# Altium footprint library SoM_Artix.PcbLib: 239 footprints (part 9 of 15)
Each footprint in its own frame and in the unit in brackets; x right, y up, seen from the top. Pads: shape width x height; smd on the part's side, far side on the other; paste and mask are expansions set on the pad; w line width, h text height; cw(c..) or ccw(c..) is an arc to the next point about the centre after c.
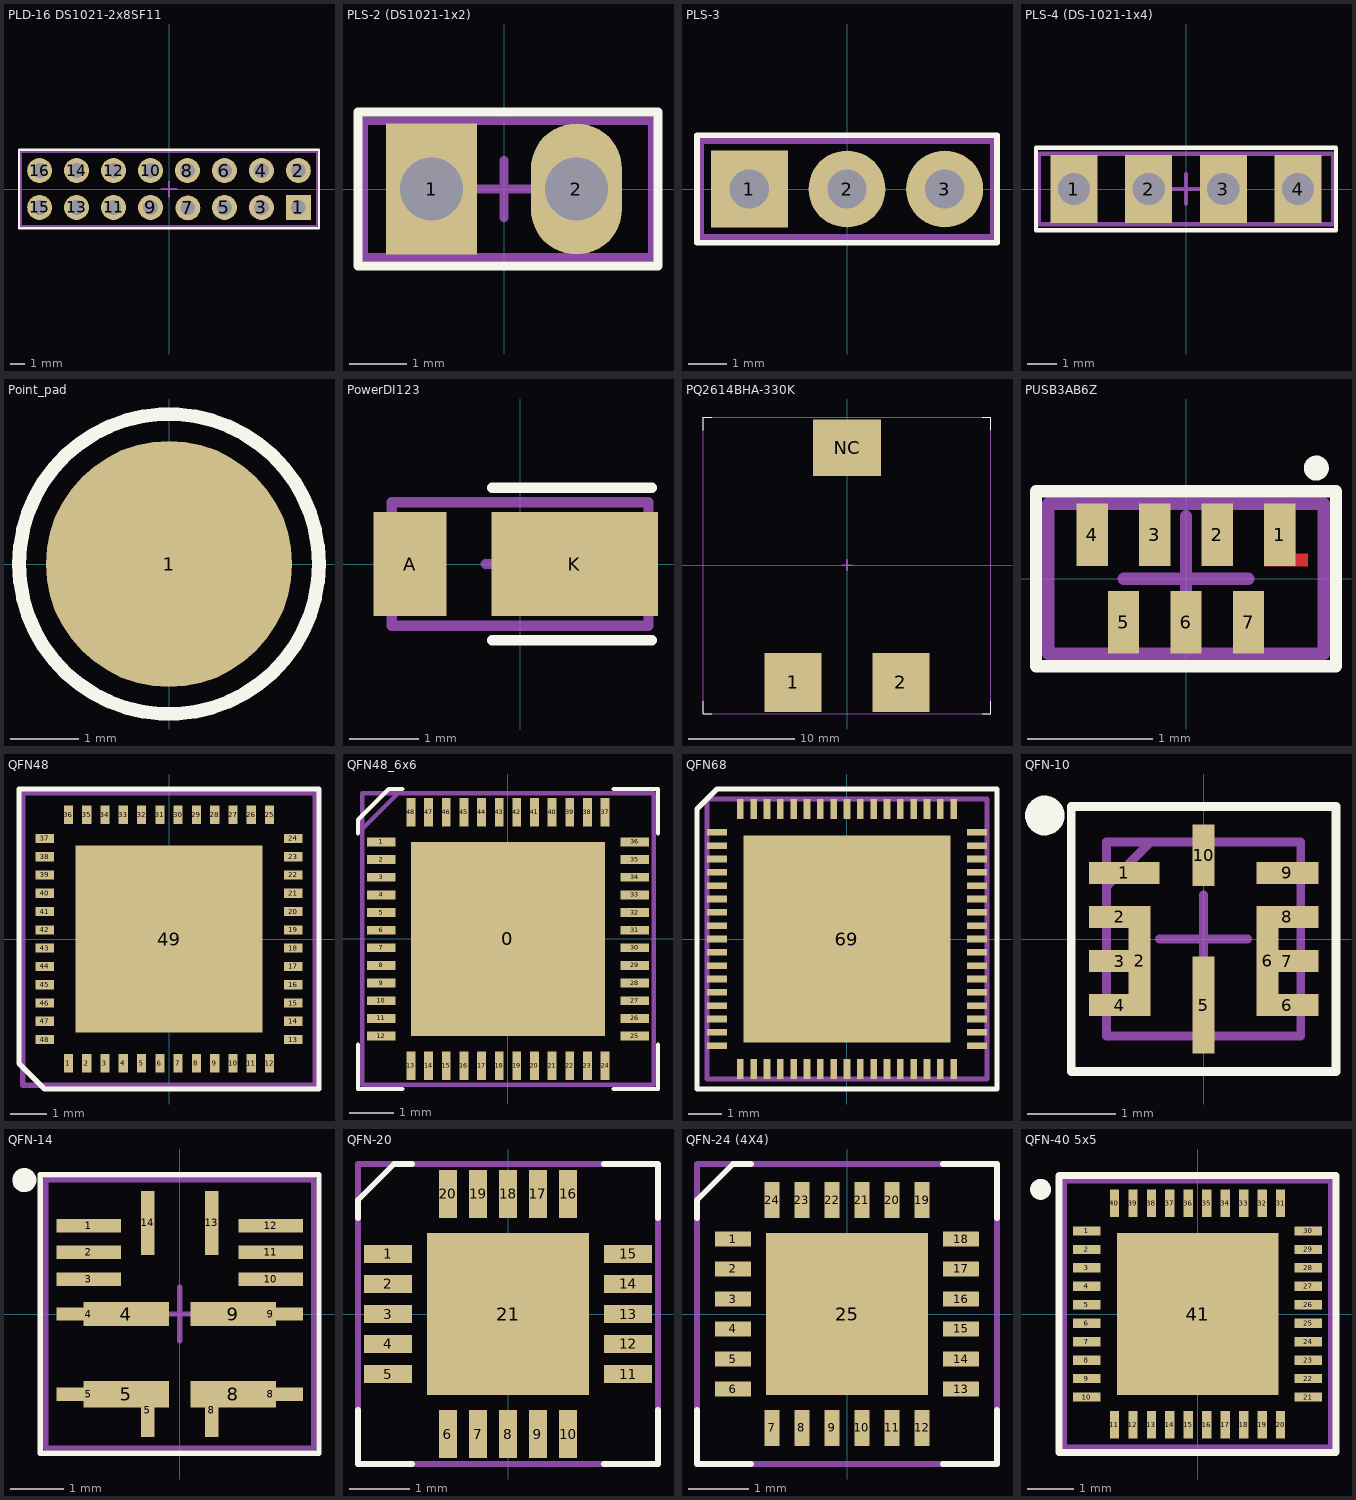
[diagram p8: the footprints below, top view; thin cyan lines are the x and y axes]

## PLD-16 DS1021-2x8SF11 [mm]
pads (16):
  rect 1.7x1.7 hole 1: 1(8.89,-1.27)
  round 1.7 hole 1: 2(8.89,1.27) 3(6.35,-1.27) 4(6.35,1.27) 5(3.81,-1.27) 6(3.81,1.27) 7(1.3,-1.3) 8(1.27,1.27) 9(-1.27,-1.27) 10(-1.27,1.27) 11(-3.81,-1.27) 12(-3.81,1.27) 13(-6.35,-1.27) 14(-6.35,1.27) 15(-8.89,-1.27) 16(-8.89,1.27)
Top Overlay:
  lines w0.15: -10.3,-2.7 10.3,-2.7 10.3,2.7 -10.3,2.7 -10.3,-2.7
Mechanical 15:
  lines w0.15: -0.5,0 0.5,0 ; 0,-0.5 0,0.5 ; -10.16,-2.54 -10.16,2.54 10.16,2.54 10.16,-2.54 -10.16,-2.54
3D body "User Library-DS1021_Male.step": height 8.54, standoff -2.96, extent -10.16,-2.55 10.16,2.53

## PLS-2 (DS1021-1x2) [mm] "2 point header"
pads (2):
  rect 1.6x2.3 hole 1.1: 1(-1.27,0)
  oval 1.6x2.3 hole 1.1: 2(1.27,0)
Top Overlay:
  lines w0.15: -2.56,-1.35 2.7,-1.35 2.7,1.35 -2.56,1.35 -2.56,-1.35
Mechanical 13:
  lines w0.15: -0.5,0 0.5,0 ; 0,-0.5 0,0.5 ; -2.46,-1.2 -2.46,1.2 2.6,1.2 2.6,-1.2 -2.46,-1.2
3D body "User Library-PLS-2-1.STEP": height 7.83, standoff -2.97, extent -2.48,-1.27 2.6,1.27

## PLS-3 [mm]
pads (3):
  rect 2x2 hole 1.02 mask+0.07: 1(-2.54,0)
  round 2 hole 1.02 mask+0.07: 2(0,0) 3(2.54,0)
Top Overlay:
  lines w0.15: -3.9,-1.4 -3.9,1.4 3.9,1.4 3.9,-1.4 -3.9,-1.4
Mechanical 15:
  lines w0.15: -0.5,0 0.5,0 ; 0,-0.5 0,0.5 ; -3.79,-1.25 3.79,-1.25 3.79,1.25 -3.79,1.25 -3.79,-1.25
3D body "User Library-PLS-03.step": height 8, standoff -3.3, extent -3.81,-1.25 3.81,1.25

## PLS-4 (DS-1021-1x4) [mm] "4 point header"
pads (4):
  rect 1.6x2.3 hole 1.1: 1(-3.81,0) 2(-1.27,0) 3(1.27,0) 4(3.81,0)
Top Overlay:
  lines w0.15: -5.1,-1.4 5.1,-1.4 5.1,1.4 -5.1,1.4 -5.1,-1.4
Mechanical 13:
  lines w0.15: -0.5,0 0.5,0 ; 0,-0.5 0,0.5 ; -5,-1.2 -5,1.2 5,1.2 5,-1.2 -5,-1.2
3D body "User Library-1x4 TH Pitch 2_54mm.STEP": height 9.2, standoff -3.5, extent -5.08,-1.27 5.08,1.27

## Point_pad [mm]
pads (1):
  round 3.6 smd: 1(0,0)
Top Overlay:
  circle w0.2: c0,0 r2.193
Mechanical 3:
  lines w0.1: -0.5,0 0.5,0 ; 0,-0.5 0,0.5
3D body "s70-332002045.stp": height 0.2, standoff 0, extent -1.6,-1.6 1.6,1.6

## PowerDI123 [mm]
height 1
pads (2):
  rect 1.05x1.5 smd: A(-1.587,0)
  rect 2.4x1.5 smd: K(0.788,0)
Top Overlay:
  lines w0.15: -0.4,-1.1 1.9,-1.1 ; -0.4,1.1 1.9,1.1
Mechanical 13:
  lines w0.15: -0.5,0 0.5,0 ; 0,-0.5 0,0.5 ; -1.85,-0.89 -1.85,0.89 1.85,0.89 1.85,-0.89 -1.85,-0.89
3D body "User Library-powerdi123.step": height 1, standoff 0, extent -2,-0.965 1.875,0.965

## PQ2614BHA-330K [mm]
pads (3):
  rect 5.33x5.59 smd: 1(-5.075,-11.037) 2(5.075,-11.037)
  rect 6.35x5.28 smd: NC(0,11.038)
Top Overlay:
  lines w0.1: -13.5,-12.8 -13.5,-14 -12.7,-14 ; -13.5,12.7 -13.5,13.9 -12.7,13.9 ; 12.7,-14 13.5,-14 13.5,-12.8 ; 12.7,13.9 13.5,13.9 13.5,12.7
Mechanical 15:
  lines w0.1: -13.5,-14 13.5,-14 13.5,13.9 -13.5,13.9 -13.5,-14
  lines w0.15: -0.5,0 0.5,0 ; 0,-0.5 0,0.5
3D body "PQ2614BHA.stp": height 15, standoff -0.1, extent -13.4,-13.45 13.4,13.725

## PUSB3AB6Z [mm] "1,1x2,1x0,5 mm"
height 0.5
pads (7):
  rect 0.25x0.5 smd mask+0.05: 1(0.75,0.35) 2(0.25,0.35) 3(-0.25,0.35) 4(-0.75,0.35) 5(-0.5,-0.35) 6(0,-0.35) 7(0.5,-0.35)
Top Layer:
  region: 0.625,0.6 0.875,0.6 0.875,0.2 0.975,0.2 0.975,0.1 0.625,0.1
Top Overlay:
  circle w0.1: c1.043,0.885 r0.05
  lines w0.1: -1.2,-0.7 1.2,-0.7 1.2,0.7 -1.2,0.7 -1.2,-0.7
Top Solder:
  region: 0.574,0.65 0.925,0.65 0.925,0.25 1.025,0.25 1.025,0.049 0.574,0.049
Mechanical 15:
  lines w0.1: -0.5,0 0.5,0 ; 0,-0.5 0,0.5 ; -1.1,-0.6 1.1,-0.6 1.1,0.6 -1.1,0.6 -1.1,-0.6

## QFN48 [mm] "6x6mm"
height 0.9
pads (49):
  rect 0.25x0.5 smd mask+0.07: 1(-2.75,-3.4) 2(-2.25,-3.4) 3(-1.75,-3.4) 4(-1.25,-3.4) 5(-0.75,-3.4) 6(-0.25,-3.4) 7(0.25,-3.4) 8(0.75,-3.4) 9(1.25,-3.4) 10(1.75,-3.4) 11(2.25,-3.4) 12(2.75,-3.4) 25(2.75,3.4) 26(2.25,3.4) 27(1.75,3.4) 28(1.25,3.4) 29(0.75,3.4) 30(0.25,3.4) 31(-0.25,3.4) 32(-0.75,3.4) 33(-1.25,3.4) 34(-1.75,3.4) 35(-2.25,3.4) 36(-2.75,3.4)
  rect 0.5x0.25 smd mask+0.07: 13(3.4,-2.75) 14(3.4,-2.25) 15(3.4,-1.75) 16(3.4,-1.25) 17(3.4,-0.75) 18(3.4,-0.25) 19(3.4,0.25) 20(3.4,0.75) 21(3.4,1.25) 22(3.4,1.75) 23(3.4,2.25) 24(3.4,2.75) 37(-3.4,2.75) 38(-3.4,2.25) 39(-3.4,1.75) 40(-3.4,1.25) 41(-3.4,0.75) 42(-3.4,0.25) 43(-3.4,-0.25) 44(-3.4,-0.75) 45(-3.4,-1.25) 46(-3.4,-1.75) 47(-3.4,-2.25) 48(-3.4,-2.75)
  rect 5.1x5.1 smd paste-2539.97 mask+0.07: 49(0,0)
Top Overlay:
  lines w0.15: -4.1,-3.4 -4.1,4.1 4.1,4.1 4.1,-4.1 -3.4,-4.1 -4.1,-3.4
Top Paste:
  rectangle: 1,-2 2,-1
  rectangle: 1,1 2,2
  rectangle: 1,-0.5 2,0.5
  rectangle: -2,-2 -1,-1
  rectangle: -2,1 -1,2
  rectangle: -2,-0.5 -1,0.5
  rectangle: -0.5,-2 0.5,-1
  rectangle: -0.5,1 0.5,2
  rectangle: -0.5,-0.5 0.5,0.5
Mechanical 15:
  lines w0.15: -0.5,0 0.5,0 ; 0,-0.5 0,0.5 ; -4,-4 4,-4 4,4 -4,4 -4,-4
3D body "ALSRobot-QFN48 7x7.step": height 0.78, standoff -0.02, extent -3.51,-3.51 3.51,3.51

## QFN48_6x6 [mm]
pads (49):
  rect 4.4x4.4 smd: 0(0,0)
  rect 0.65x0.2 smd: 1(-2.875,2.2) 2(-2.875,1.8) 3(-2.875,1.4) 4(-2.875,1) 5(-2.875,0.6) 6(-2.875,0.2) 7(-2.875,-0.2) 8(-2.875,-0.6) 9(-2.875,-1) 10(-2.875,-1.4) 11(-2.875,-1.8) 12(-2.875,-2.2) 25(2.875,-2.2) 26(2.875,-1.8) 27(2.875,-1.4) 28(2.875,-1) 29(2.875,-0.6) 30(2.875,-0.2) 31(2.875,0.2) 32(2.875,0.6) 33(2.875,1) 34(2.875,1.4) 35(2.875,1.8) 36(2.875,2.2)
  rect 0.2x0.65 smd: 13(-2.2,-2.875) 14(-1.8,-2.875) 15(-1.4,-2.875) 16(-1,-2.875) 17(-0.6,-2.875) 18(-0.2,-2.875) 19(0.2,-2.875) 20(0.6,-2.875) 21(1,-2.875) 22(1.4,-2.875) 23(1.8,-2.875) 24(2.2,-2.875) 37(2.2,2.875) 38(1.8,2.875) 39(1.4,2.875) 40(1,2.875) 41(0.6,2.875) 42(0.2,2.875) 43(-0.2,2.875) 44(-0.6,2.875) 45(-1,2.875) 46(-1.4,2.875) 47(-1.8,2.875) 48(-2.2,2.875)
Top Overlay:
  lines w0.1: -3.4,-2.4 -3.4,-3.4 -2.4,-3.4 ; -3.4,2.4 -3.4,2.7 -2.7,3.4 -2.4,3.4 ; 2.4,-3.4 3.4,-3.4 3.4,-2.4 ; 2.4,3.4 3.4,3.4 3.4,2.4
Mechanical 15:
  lines w0.1: -3.3,2.5 -2.5,3.3 ; -0.5,0 0.5,0 ; 0,-0.5 0,0.5 ; -3.3,-3.3 -3.3,3.3 3.3,3.3 3.3,-3.3 -3.3,-3.3
3D body "User Library-QFN48_0_4.step": height 0.91, standoff 0, extent -3,-3 3,3

## QFN68 [mm]
pads (69):
  rect 0.6x0.2 smd: 1(-3.9,3.2) 2(-3.9,2.8) 3(-3.9,2.4) 4(-3.9,2) 5(-3.9,1.6) 6(-3.9,1.2) 7(-3.9,0.8) 8(-3.9,0.4) 9(-3.9,0) 10(-3.9,-0.4) 11(-3.9,-0.8) 12(-3.9,-1.2) 13(-3.9,-1.6) 14(-3.9,-2) 15(-3.9,-2.4) 16(-3.9,-2.8) 17(-3.9,-3.2) 35(3.9,-3.2) 36(3.9,-2.8) 37(3.9,-2.4) 38(3.9,-2) 39(3.9,-1.6) 40(3.9,-1.2) 41(3.9,-0.8) 42(3.9,-0.4) 43(3.9,0) 44(3.9,0.4) 45(3.9,0.8) 46(3.9,1.2) 47(3.9,1.6) 48(3.9,2) 49(3.9,2.4) 50(3.9,2.8) 51(3.9,3.2)
  rect 0.2x0.6 smd: 18(-3.2,-3.9) 19(-2.8,-3.9) 20(-2.4,-3.9) 21(-2,-3.9) 22(-1.6,-3.9) 23(-1.2,-3.9) 24(-0.8,-3.9) 25(-0.4,-3.9) 26(0,-3.9) 27(0.4,-3.9) 28(0.8,-3.9) 29(1.2,-3.9) 30(1.6,-3.9) 31(2,-3.9) 32(2.4,-3.9) 33(2.8,-3.9) 34(3.2,-3.9) 52(3.2,3.9) 53(2.8,3.9) 54(2.4,3.9) 55(2,3.9) 56(1.6,3.9) 57(1.2,3.9) 58(0.8,3.9) 59(0.4,3.9) 60(0,3.9) 61(-0.4,3.9) 62(-0.8,3.9) 63(-1.2,3.9) 64(-1.6,3.9) 65(-2,3.9) 66(-2.4,3.9) 67(-2.8,3.9) 68(-3.2,3.9)
  rect 6.2x6.2 smd: 69(0,0)
Top Overlay:
  lines w0.15: -4.5,-4.5 4.5,-4.5 4.5,4.5 -3.9,4.5 -4.5,3.9 -4.5,-4.5
Mechanical 13:
  lines w0.15: -0.5,0 0.5,0 ; 0,-0.5 0,0.5 ; -4.2,-4.2 4.2,-4.2 4.2,4.2 -4.2,4.2 -4.2,-4.2
3D body "User Library-QFN68(8x8mm).step": height 0.85, standoff 0, extent -4.02,-4.02 4.02,4.02

## QFN-10 [mm] "2mmx2mmx1.6mm"
height 1.6
pads (12):
  rect 0.8x0.25 smd: 1(-0.9,0.75)
  rect 0.7x0.25 smd: 2(-0.95,0.25) 3(-0.95,-0.25) 4(-0.95,-0.75) 6(0.95,-0.75) 7(0.95,-0.25) 8(0.95,0.25) 9(0.95,0.75)
  rect 0.25x1.1 smd: 2(-0.725,-0.245) 5(0,-0.75) 6(0.725,-0.245)
  rect 0.25x0.7 smd: 10(0,0.95)
Top Overlay:
  circle w0.25: c-1.8,1.4 r0.1
  lines w0.1: -1.5,-1.5 -1.5,1.5 1.5,1.5 1.5,-1.5 -1.5,-1.5
Mechanical 15:
  lines w0.1: -1.1,0.6 -0.6,1.1 ; -0.5,0 0.5,0 ; 0,-0.5 0,0.5 ; -1.1,-1.1 -1.1,1.1 1.1,1.1 1.1,-1.1 -1.1,-1.1
3D body "User Library-QFN10.step": height 0.5, standoff 0, extent -1,-1 1,1

## QFN-14 [mm] "QFN-14 (4mmx4mmx1.6mm)"
height 1.6
pads (18):
  rect 1.2x0.25 smd: 1(-1.7,1.65) 2(-1.7,1.15) 3(-1.7,0.65) 4(-1.7,0) 5(-1.7,-1.5) 8(1.7,-1.5) 9(1.7,0) 10(1.7,0.65) 11(1.7,1.15) 12(1.7,1.65)
  rect 1.6x0.45 smd: 4(-1,0) 9(1,0)
  rect 1.6x0.5 smd: 5(-1,-1.5) 8(1,-1.5)
  rect 0.25x1 smd: 5(-0.6,-1.8) 8(0.6,-1.8)
  rect 0.25x1.2 smd: 13(0.6,1.7) 14(-0.6,1.7)
Top Overlay:
  circle w0.25: c-2.9,2.5 r0.1
  lines w0.1: -2.6,-2.6 -2.6,2.6 2.6,2.6 2.6,-2.6 -2.6,-2.6
Mechanical 15:
  lines w0.1: -0.5,0 0.5,0 ; 0,-0.5 0,0.5 ; -2.5,-2.5 -2.5,2.5 2.5,2.5 2.5,-2.5 -2.5,-2.5
3D body "QFN-14.STEP": height 1.61, standoff -0.02, extent -1.99,-2 2.01,2

## QFN-20 [mm]
pads (21):
  rect 0.8x0.3 smd mask+0.05: 1(-2,1) 2(-2,0.5) 3(-2,0) 4(-2,-0.5) 5(-2,-1) 11(2,-1) 12(2,-0.5) 13(2,0) 14(2,0.5) 15(2,1)
  rect 0.3x0.8 smd mask+0.05: 6(-1,-2) 7(-0.5,-2) 8(0,-2) 9(0.5,-2) 10(1,-2) 16(1,2) 17(0.5,2) 18(0,2) 19(-0.5,2) 20(-1,2)
  rect 2.7x2.7 smd mask+0.05: 21(0,0)
Top Overlay:
  lines w0.1: -2.5,-1.6 -2.5,-2.5 -1.6,-2.5 ; -2.5,1.6 -2.5,1.9 -1.9,2.5 -1.6,2.5 ; 1.6,-2.5 2.5,-2.5 2.5,-1.6 ; 1.6,2.5 2.5,2.5 2.5,1.6
Mechanical 15:
  lines w0.1: -0.5,0 0.5,0 ; 0,-0.5 0,0.5 ; -2.5,-2.5 2.5,-2.5 2.5,2.5 -2.5,2.5 -2.5,-2.5
3D body "User Library-QFN20_4x4x0_8.step": height 0.78, standoff -0.02, extent -2.01,-2.01 2.01,2.01

## QFN-24 (4X4) [mm]
pads (25):
  rect 0.6x0.25 smd mask+0.05: 1(-1.9,1.25) 2(-1.9,0.75) 3(-1.9,0.25) 4(-1.9,-0.25) 5(-1.9,-0.75) 6(-1.9,-1.25) 13(1.9,-1.25) 14(1.9,-0.75) 15(1.9,-0.25) 16(1.9,0.25) 17(1.9,0.75) 18(1.9,1.25)
  rect 0.25x0.6 smd mask+0.05: 7(-1.25,-1.9) 8(-0.75,-1.9) 9(-0.25,-1.9) 10(0.25,-1.9) 11(0.75,-1.9) 12(1.25,-1.9) 19(1.25,1.9) 20(0.75,1.9) 21(0.25,1.9) 22(-0.25,1.9) 23(-0.75,1.9) 24(-1.25,1.9)
  rect 2.7x2.7 smd mask+0.05: 25(0,0)
Top Overlay:
  lines w0.1: -2.5,-1.6 -2.5,-2.5 -1.6,-2.5 ; -2.5,1.6 -2.5,1.9 -1.9,2.5 -1.6,2.5 ; 1.6,-2.5 2.5,-2.5 2.5,-1.6 ; 1.6,2.5 2.5,2.5 2.5,1.6
Mechanical 15:
  lines w0.1: -0.5,0 0.5,0 ; 0,-0.5 0,0.5 ; -2.5,-2.5 -2.5,2.5 2.5,2.5 2.5,-2.5 -2.5,-2.5
3D body "User Library-QFN24.step": height 0.9, standoff 0, extent -2.005,-2.005 2.005,2.005

## QFN-40 5x5 [mm]
pads (41):
  rect 0.6x0.2 smd: 1(-2.4,1.8) 2(-2.4,1.4) 3(-2.4,1) 4(-2.4,0.6) 5(-2.4,0.2) 6(-2.4,-0.2) 7(-2.4,-0.6) 8(-2.4,-1) 9(-2.4,-1.4) 10(-2.4,-1.8) 21(2.4,-1.8) 22(2.4,-1.4) 23(2.4,-1) 24(2.4,-0.6) 25(2.4,-0.2) 26(2.4,0.2) 27(2.4,0.6) 28(2.4,1) 29(2.4,1.4) 30(2.4,1.8)
  rect 0.2x0.6 smd: 11(-1.8,-2.4) 12(-1.4,-2.4) 13(-1,-2.4) 14(-0.6,-2.4) 15(-0.2,-2.4) 16(0.2,-2.4) 17(0.6,-2.4) 18(1,-2.4) 19(1.4,-2.4) 20(1.8,-2.4) 31(1.8,2.4) 32(1.4,2.4) 33(1,2.4) 34(0.6,2.4) 35(0.2,2.4) 36(-0.2,2.4) 37(-0.6,2.4) 38(-1,2.4) 39(-1.4,2.4) 40(-1.8,2.4)
  rect 3.5x3.5 smd: 41(0,0)
Top Overlay:
  circle w0.25: c-3.4,2.7 r0.1
  lines w0.15: -3,-3 -3,3 3,3 3,-3 -3,-3
Mechanical 13:
  lines w0.15: -0.5,0 0.5,0 ; 0,-0.5 0,0.5 ; -2.9,-2.9 -2.9,2.9 2.9,2.9 2.9,-2.9 -2.9,-2.9
3D body "User Library-QFN40_500_500_090_360P040.step": height 0.9, standoff 0, extent -2.505,-2.505 2.505,2.505